# Altium footprint library microbuilder.PCBLIB: 422 footprints (part 27 of 27)
Each footprint in its own frame and in the unit in brackets; x right, y up, seen from the top. Pads: shape width x height; smd on the part's side, far side on the other; paste and mask are expansions set on the pad; w line width, h text height; cw(c..) or ccw(c..) is an arc to the next point about the centre after c.
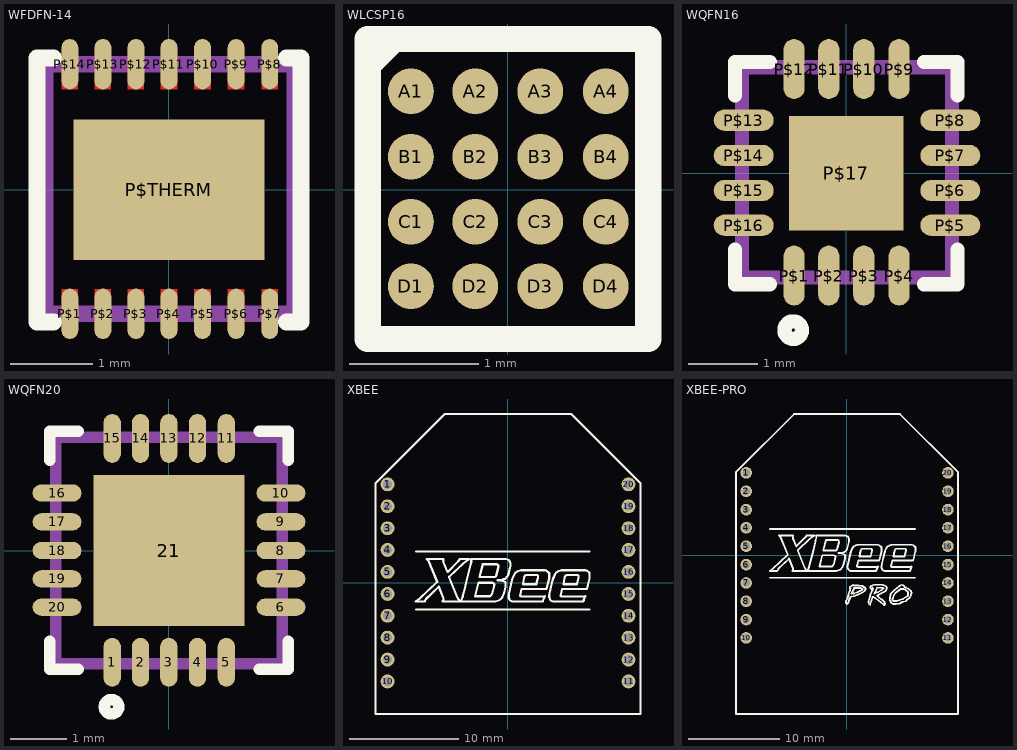
[diagram p26: the footprints below, top view; thin cyan lines are the x and y axes]

## WFDFN-14 [mil]
pads (15):
  rrect100% 8x24 smd: P$1(-47.24,-59.06) P$2(-31.5,-59.06) P$3(-15.75,-59.06) P$4(0,-59.06) P$5(16,-59.06) P$6(32,-59.06) P$7(48,-59.06) P$8(48,60) P$9(32,60) P$10(16,60) P$11(0,60) P$12(-15.75,60) P$13(-31.5,60) P$14(-47.24,60)
  rect 91x67 smd: P$THERM(0,0)
Top Layer:
  rectangle: -51.18,-66.93 -43.31,-47.24
  rectangle: -35.43,-66.93 -27.56,-47.24
  rectangle: -19.68,-66.93 -11.81,-47.24
  rectangle: -3.94,-66.93 4,-47.24
  rectangle: 12,-66.93 20,-47.24
  rectangle: 28,-66.93 36,-47.24
  rectangle: 44,-66.93 52,-47.24
  rectangle: -51.18,48 -43.31,67
  rectangle: -35.43,48 -27.56,67
  rectangle: -19.68,48 -11.81,67
  rectangle: -3.94,48 4,67
  rectangle: 12,48 20,67
  rectangle: 28,48 36,67
  rectangle: 44,48 52,67
Top Overlay:
  lines w8: -55.12,-62.99 -62.99,-62.99 -62.99,63 -55.12,63 ; 56,-62.99 63,-62.99 63,63 56,63
Mechanical 16:
  lines w8: -59.06,-59.06 60,-59.06 60,60 -59.06,60 -59.06,-59.06

## WLCSP16 [mil]
pads (16):
  rrect100% 14x14 smd: A1(-29.53,30) A2(-9.84,30) A3(10,30) A4(30,30) B1(-29.53,10) B2(-9.84,10) B3(10,10) B4(30,10) C1(-29.53,-9.84) C2(-9.84,-9.84) C3(10,-9.84) C4(30,-9.84) D1(-29.53,-29.53) D2(-9.84,-29.53) D3(10,-29.53) D4(30,-29.53)
Top Overlay:
  lines w8: -42.72,38 -42.72,-45.67 43,-45.67 43,46 -34.84,46 ; -42.72,38 -42.72,46 -34.84,46 ; -42.72,38 -34.84,46
Top Solder:
  circle w0: c-29.53,30 r8
  circle w0: c-29.53,10 r8
  circle w0: c-29.53,-9.84 r8
  circle w0: c-29.53,-29.53 r8
  circle w0: c-9.84,30 r8
  circle w0: c-9.84,10 r8
  circle w0: c-9.84,-9.84 r8
  circle w0: c-9.84,-29.53 r8
  circle w0: c10,30 r8
  circle w0: c10,10 r8
  circle w0: c10,-9.84 r8
  circle w0: c10,-29.53 r8
  circle w0: c30,30 r8
  circle w0: c30,10 r8
  circle w0: c30,-9.84 r8
  circle w0: c30,-29.53 r8

## WQFN16 [mil]
pads (17):
  rrect100% 12x34 smd: P$1(-29.53,-58.07) P$2(-9.84,-58.07) P$3(10,-58.07) P$4(30,-58.07) P$9(30,59) P$10(10,59) P$11(-9.84,59) P$12(-29.53,59)
  rrect100% 34x12 smd: P$5(59,-29.53) P$6(59,-9.84) P$7(59,10) P$8(59,30) P$13(-58.07,30) P$14(-58.07,10) P$15(-58.07,-9.84) P$16(-58.07,-29.53)
  rect 65x65 smd: P$17(0,0)
Top Overlay:
  circle w8: c-30,-89 r5
  lines w8: -62.99,-43.31 -62.99,-62.99 -43.31,-62.99 ; -62.99,44 -62.99,63 -43.31,63 ; 44,-62.99 63,-62.99 63,-43.31 ; 44,63 63,63 63,44
Top Paste:
  rectangle: -31.5,4 -3.94,32
  rectangle: 4,4 32,32
  rectangle: -31.5,-31.5 -3.94,-3.94
  rectangle: 4,-31.5 32,-3.94
Mechanical 16:
  lines w8: -59.06,-59.06 60,-59.06 60,60 -59.06,60 -59.06,-59.06

## WQFN20 [mil]
pads (21):
  rrect100% 12x34 smd: 1(-39.37,-77.76) 2(-19.68,-77.76) 3(0,-77.76) 4(20,-77.76) 5(40,-77.76) 11(40,78) 12(20,78) 13(0,78) 14(-19.68,78) 15(-39.37,78)
  rrect100% 34x12 smd: 6(78,-39.37) 7(78,-19.68) 8(78,0) 9(78,20) 10(78,40) 16(-77.76,40) 17(-77.76,20) 18(-77.76,0) 19(-77.76,-19.68) 20(-77.76,-39.37)
  rect 105x105 smd: 21(0,0)
Top Overlay:
  circle w8: c-39.84,-108.69 r5
  lines w8: -82.68,-62.99 -82.68,-82.68 -62.99,-82.68 ; -82.68,63 -82.68,83 -62.99,83 ; 63,-82.68 83,-82.68 83,-62.99 ; 63,83 83,83 83,63
Top Paste:
  rectangle: -49.21,6 -5.91,50
  rectangle: 6,6 50,50
  rectangle: 6,-49.21 50,-5.91
  rectangle: -49.21,-49.21 -5.91,-5.91
Mechanical 16:
  lines w8: -78.74,-78.74 79,-78.74 79,79 -78.74,79 -78.74,-78.74

## XBEE [mil]
pads (20):
  round 50 hole 32: 1(-433.07,355) 2(-433.07,276) 3(-433.07,197) 4(-433.07,119) 5(-433.07,40) 6(-433.07,-39.37) 7(-433.07,-118.11) 8(-433.07,-196.85) 9(-433.07,-275.59) 10(-433.07,-354.33) 11(434,-354.33) 12(434,-275.59) 13(434,-196.85) 14(434,-118.11) 15(434,-39.37) 16(434,40) 17(434,119) 18(434,197) 19(434,276) 20(434,355)
Top Overlay:
  drawing of 163 lines, arcs and shapes, not listed

## XBEE-PRO [mil]
pads (20):
  round 50 hole 32: 1(-433.07,355) 2(-433.07,276) 3(-433.07,197) 4(-433.07,119) 5(-433.07,40) 6(-433.07,-39.37) 7(-433.07,-118.11) 8(-433.07,-196.85) 9(-433.07,-275.59) 10(-433.07,-354.33) 11(434,-354.33) 12(434,-275.59) 13(434,-196.85) 14(434,-118.11) 15(434,-39.37) 16(434,40) 17(434,119) 18(434,197) 19(434,276) 20(434,355)
Top Overlay:
  drawing of 309 lines, arcs and shapes, not listed